# Altium footprint library custom.PcbLib: 305 footprints (part 18 of 20)
Each footprint in its own frame and in the unit in brackets; x right, y up, seen from the top. Pads: shape width x height; smd on the part's side, far side on the other; paste and mask are expansions set on the pad; w line width, h text height; cw(c..) or ccw(c..) is an arc to the next point about the centre after c.
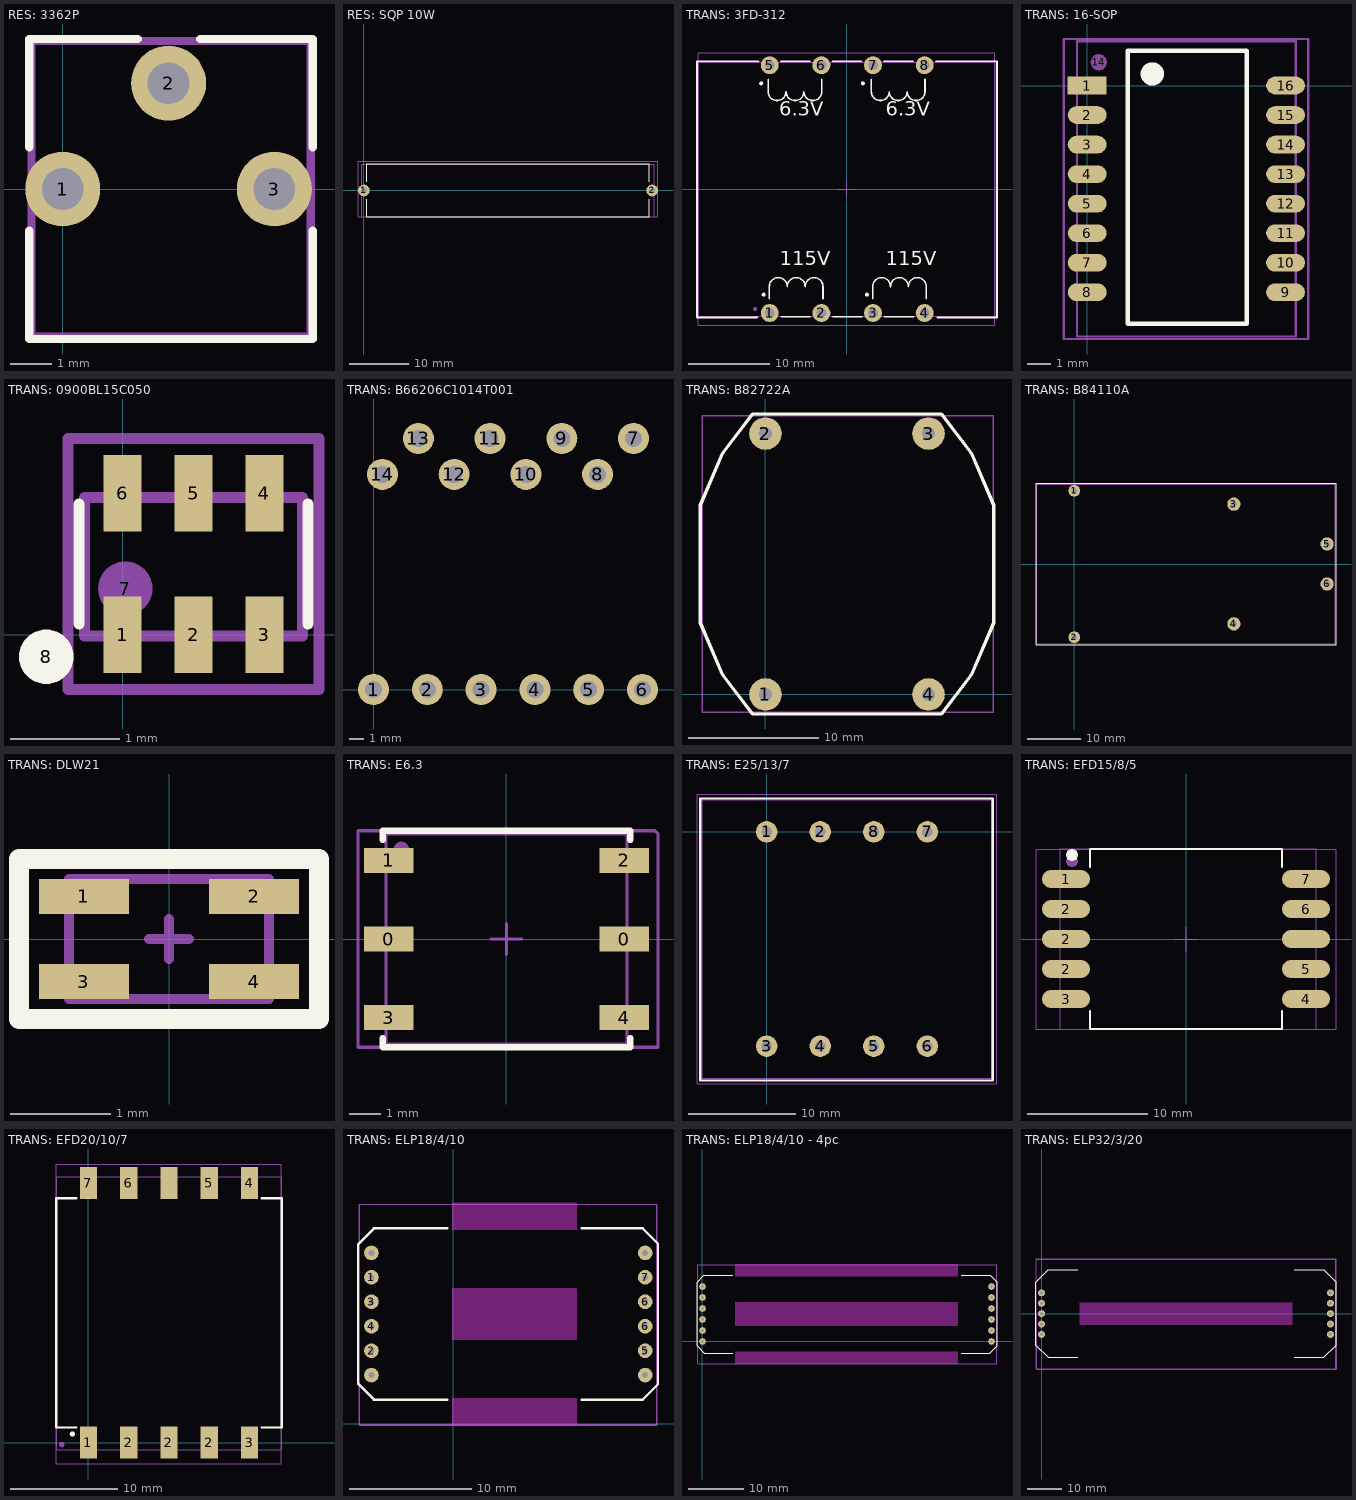
[diagram p17: the footprints below, top view; thin cyan lines are the x and y axes]

## RES: 3362P [mm]
pads (3):
  round 1.8 hole 1: 1(0,0) 2(2.54,2.54) 3(5.08,0)
Top Overlay:
  lines w0.2: -0.8,-1 -0.8,-3.6 6,-3.6 6,-1 ; -0.8,1 -0.8,3.6 1.8,3.6 ; 3.3,3.6 6,3.6 6,1
Top Assy:
  lines w0.1: -0.7,-3.49 5.9,-3.49 5.9,3.5 -0.7,3.5 -0.7,-3.49
Size Area:
  lines w0.1: -0.8,-3.6 6,-3.6 6,3.6 -0.8,3.6 -0.8,-3.6
3D body "User Library-R_3362P.STEP": height 4.5, standoff -3, extent -0.7,-3.49 5.9,3.5

## RES: SQP 10W [mm]
pads (2):
  round 2 hole 1: 1(0,0) 2(49,0)
Top Overlay:
  lines w0.2: 0.5,-1.5 0.5,-4.5 48.5,-4.5 48.5,-1.5 ; 0.5,1.5 0.5,4.5 48.5,4.5 48.5,1.5
Top Assy:
  lines w0.1: -0.4,4.4 -0.4,-4.5 49.4,-4.5 49.4,4.5 -0.4,4.5
Size Area:
  lines w0.1: -1,-4.5 -1,5 50,5 50,-4.5 -1,-4.5
3D body "User Library-SQP10AJB-1R8.STEP": height 10.55, standoff -4.04, extent -0.4,-4.5 49.4,4.5

## TRANS: 3FD-312 [mm]
pads (13):
  round 2.2 hole 1.2: 1(-9.45,-15.25) 2(-3.1,-15.25) 3(3.25,-15.25) 4(9.6,-15.25) 5(-9.45,15.23) 6(-3.1,15.23) 7(3.25,15.23) 8(9.6,15.23)
  round 0.5 on Mech1: ""(-11.25,-14.75)
  round 0.5 on Top Overlay: ""(-10.5,13) ""(-10.2,-13) ""(2,13) ""(2.5,-13)
Top Overlay:
  lines w0.2: -11,-15.8 -18.4,-15.8 -18.4,15.7 -10.8,15.7 ; -9.65,13.48 -9.65,11.98 ccw(c-8.55,11.98) -7.45,11.98 ccw(c-6.35,11.98) -5.25,11.98 ccw(c-4.15,11.98) -3.05,11.98 -3.05,13.48 ; -9.5,-13.5 -9.5,-12 cw(c-8.4,-12) -7.3,-12 cw(c-6.2,-12) -5.1,-12 cw(c-4,-12) -2.9,-12 -2.9,-13.5 ; -8.1,15.7 -4.5,15.7 ; -8.05,-15.72 -4.45,-15.72 ; -1.75,15.7 1.85,15.7 ; -1.7,-15.72 1.9,-15.72 ; 3.05,13.48 3.05,11.98 ccw(c4.15,11.98) 5.25,11.98 ccw(c6.35,11.98) 7.45,11.98 ccw(c8.55,11.98) 9.65,11.98 9.65,13.48 ; 3.2,-13.5 3.2,-12 cw(c4.3,-12) 5.4,-12 cw(c6.5,-12) 7.6,-12 cw(c8.7,-12) 9.8,-12 9.8,-13.5 ; 4.6,15.7 8.2,15.7 ; 4.65,-15.72 8.25,-15.72 ; 10.95,15.7 18.5,15.7 18.5,-15.8 11.15,-15.8
  text "115V" at -8.2,-10 h3
  text "115V" at 4.8,-10 h3
  text "6.3V" at -8.3,8.4 h3
  text "6.3V" at 4.8,8.4 h3
Top Assy:
  lines w0.1: -18.235,-15.65 -18.235,15.59 18.335,15.59 18.335,-15.65 -18.235,-15.65
Size Area:
  lines w0.1: -1,0 1,0 ; 0,-1 0,1 ; -18.25,-16.75 18.25,-16.75 18.25,16.75 -18.25,16.75 -18.25,-16.75
3D body "User Library-Tamura 3FD-312.STEP": height 32.1, standoff -4.8, extent -18.235,-15.65 18.335,15.59

## TRANS: 16-SOP [mm]
pads (17):
  rect 1.67x0.76 smd: 1(0,0)
  oval 1.67x0.76 smd: 2(0,-1.27) 3(0,-2.54) 4(0,-3.81) 5(0,-5.08) 6(0,-6.35) 7(0,-7.62) 8(0,-8.89) 9(8.53,-8.89) 10(8.53,-7.62) 11(8.53,-6.35) 12(8.53,-5.08) 13(8.53,-3.81) 14(8.53,-2.54) 15(8.53,-1.27) 16(8.53,0)
  round 0.7 on Mech1: 14(0.5,1)
Top Overlay:
  circle w0.6: c2.8,0.5 r0.2
  lines w0.2: 4.583,1.5 6.86,1.5 6.86,-10.25 1.75,-10.25 1.75,1.5 6,1.5
Top Assy:
  lines w0.1: -0.435,-10.795 -0.435,1.905 8.965,1.905 8.965,-10.795 -0.435,-10.795
Size Area:
  lines w0.1: -1,-10.9 9.5,-10.9 9.5,2 -1,2 -1,-10.9
3D body "User Library-smt4.step": height 5.1, standoff 0, extent -0.435,-10.795 8.965,1.905

## TRANS: 0900BL15C050 [mm]
pads (8):
  rect 0.35x0.7 smd: 1(0,0) 2(0.65,0) 3(1.3,0) 4(1.3,1.3) 5(0.65,1.3) 6(0,1.3)
  round 0.5 on Mech1: 7(0.025,0.425)
  round 0.5 on Top Overlay: 8(-0.7,-0.2)
Top Overlay:
  lines w0.1: -0.4,0.1 -0.4,1.2 ; 1.7,0.1 1.7,1.2
Top Assy:
  lines w0.1: -0.35,-0.01 -0.35,1.26 1.65,1.26 1.65,-0.01 -0.35,-0.01
Size Area:
  lines w0.1: -0.5,-0.5 -0.5,1.8 1.8,1.8 1.8,-0.5 -0.5,-0.5
3D body "User Library-1600BL15B100E.STEP": height 0.84, standoff -0.02, extent -0.35,-0.01 1.65,1.26

## TRANS: B66206C1014T001 [mm]
pads (14):
  round 2.2 hole 1.2: 1(0,0) 2(3.81,0) 3(7.62,0) 4(11.43,0) 5(15.24,0) 6(19.05,0) 7(18.415,17.78) 8(15.875,15.24) 9(13.335,17.78) 10(10.795,15.24) 11(8.255,17.78) 12(5.715,15.24) 13(3.175,17.78) 14(0.635,15.24)

## TRANS: B82722A [mm]
pads (4):
  round 2.5 hole 1: 1(0,0) 2(0,20) 3(12.5,20) 4(12.5,0)
Top Overlay:
  lines w0.254: -5,5.5 -5,14.5 -3.286,18.5 -1,21.5 13.5,21.5 15.786,18.5 17.5,14.5 17.5,5.5 15.786,1.5 13.5,-1.5 -1,-1.5 -3.286,1.5 -5,5.5
Top Assy:
  lines w0.1: -4.85,-1.35 -4.85,21.35 17.45,21.35 17.45,-1.35 -4.85,-1.35
3D body "User Library-B82722A.STEP": height 13.31, standoff -3.2, extent -4.85,-1.35 17.45,21.35

## TRANS: B84110A [mm]
pads (6):
  round 2.2 hole 1.1: 1(0,13.75) 2(0,-13.75)
  round 2.5 hole 1.2: 3(30,11.25) 4(30,-11.25) 5(47.5,3.75) 6(47.5,-3.75)
Top Overlay:
  lines w0.2: -7.175,-15.175 49.175,-15.175 49.175,15.175 -7.175,15.175 -7.175,-15.175
Top Assy:
  lines w0.1: 49,15 -7,15 -7,-15 49,-15 49,15 ; 49,15 49,15
Size Area:
  lines w0.1: -7,-15 -7,15 49,15 49,-15 -7,-15
3D body "B84110A.stp": height 23.1, standoff -4, extent -7,-15 49,15

## TRANS: DLW21 [mm]
pads (4):
  rect 0.9x0.35 smd: 1(-0.85,0.425) 2(0.85,0.425) 3(-0.85,-0.425) 4(0.85,-0.425)
Top Overlay:
  lines w0.2: -1.5,-0.8 -1.5,0.8 1.5,0.8 1.5,-0.8 -1.5,-0.8
Top Assy:
  lines w0.1: -1,-0.6 1,-0.6 1,0.6 -1,0.6 -1,-0.6
Size Area:
  lines w0.1: -0.2,0 0.2,0 ; 0,-0.2 0,0.2 ; -1.5,-0.8 1.5,-0.8 1.5,0.8 -1.5,0.8 -1.5,-0.8
3D body "User Library-EMI Filter DLW21S.STEP": height 1.2, standoff 0, extent -1,-0.6 1,0.6

## TRANS: E6.3 [mm]
pads (7):
  rect 1.6x0.8 smd: 0(-3.81,0) 0(3.81,0) 1(-3.81,2.54) 2(3.81,2.54) 3(-3.81,-2.54) 4(3.81,-2.54)
  round 0.5 on Mech1: ""(-3.4,2.9)
Top Overlay:
  lines w0.2: -4,-3.2 -4,-3.5 4,-3.5 4,-3.2 ; -4,3.2 -4,3.5 4,3.5 4,3.2
Top Assy:
  lines w0.1: -3.9,-3.4 -3.9,3.4 3.9,3.4 3.9,-3.4 -3.9,-3.4
Size Area:
  lines w0.1: -0.5,0 0.5,0 ; 0,-0.5 0,0.5 ; -4.8,-3.5 -4.8,3.5 4.8,3.5 4.9,3.4 4.9,-3.5 -4.8,-3.5
3D body "E6.3.STEP": height 5.05, standoff 0, extent -3.9,-3.4 3.9,3.4

## TRANS: E25/13/7 [mm]
pads (8):
  round 2 hole 1: 1(0,0) 2(5,0) 3(0,-20) 4(5,-20) 5(10,-20) 6(15,-20) 7(15,0) 8(10,0)
Top Overlay:
  lines w0.2: -6.2,-23.2 21.1,-23.2 21.1,3.1 -6.2,3.1 -6.2,-23.2
Top Assy:
  lines w0.1: -6,-23 21,-23 21,3 -6,3 -6,-23
Size Area:
  lines w0.1: -6.5,-23.5 -6.5,3.5 21.5,3.5 21.5,-23.5 -6.5,-23.5
3D body "User Library-Choke_E25.STEP": height 21.05, standoff -2.65, extent -6,-23 21,3

## TRANS: EFD15/8/5 [mm]
pads (12):
  rrect100% 4x1.5 smd: 1(-10,5) 2(-10,-2.5) 2(-10,0) 2(-10,2.5) 3(-10,-5) 4(10,-5) 5(10,-2.5) 6(10,2.5) 7(10,5) ""(10,0)
  round 1 on Mech1: ""(-9.5,6.5)
  round 1 on Top Overlay: ""(-9.5,7)
Top Overlay:
  lines w0.2: -8,-6 -8,-7.5 8,-7.5 8,-6 ; -8,6 -8,7.5 8,7.5 8,6
Top Assy:
  lines w0.1: -10.5,-7.5 10.85,-7.5 10.85,7.5 -10.5,7.5 -10.5,-7.5
Size Area:
  lines w0.1: -1,0 1,0 ; 0,-1 0,1 ; -12.5,-7.5 -12.5,7.5 12.5,7.5 12.5,-7.5 -12.5,-7.5
3D body "EFD15.STEP": height 8.15, standoff -0.05, extent -10.5,-7.5 10.85,7.5
3D body: height 0.25, standoff 0, extent -7.5,15 -7.5,15

## TRANS: EFD20/10/7 [mm]
pads (12):
  rect 1.6x3 smd: 1(0,0) 2(3.76,0) 2(7.52,0) 2(11.28,0) 3(15.04,0) 4(15.04,24.22) 5(11.28,24.22) 6(3.76,24.22) 7(0,24.22) ""(7.52,24.22)
  round 0.5 on Mech1: ""(-2.5,-0.2)
  round 0.5 on Top Overlay: ""(-1.5,0.8)
Top Overlay:
  lines w0.2: -1.1,1.4 -3,1.4 -3,22.8 -1.1,22.8 ; 16.14,1.4 18.04,1.4 18.04,22.8 16.14,22.8
Top Assy:
  lines w0.1: -2.96,-0.685 18.04,-0.685 18.04,24.815 -2.96,24.815 -2.96,-0.685
Size Area:
  lines w0.1: -3,-2 18,-2 18,26 -3,26 -3,-2
3D body "EFD20 SMD.STEP": height 10.41, standoff 0, extent -3.06,-0.685 17.94,24.815

## TRANS: ELP18/4/10 [mm]
pads (12):
  round 1.2 hole 0.5: 1(-6.7,12) 2(-6.7,6) 3(-6.7,10) 4(-6.7,8) 5(15.7,6) 6(15.7,8) 6(15.7,10) 7(15.7,12) ""(-6.7,4) ""(-6.7,14) ""(15.7,4) ""(15.7,14)
Top Overlay:
  lines w0.2: -0.5,2 -4.3,2 -6.5,2 -7.8,3.3 -7.8,14.7 -6.5,16 -0.5,16 ; 10.5,2 13.2,2 15.5,2 16.75,3.25 16.75,14.75 15.5,16 10.5,16
Keep-Out Layer:
  board cut-out: -0.1,-0.1 10.1,-0.1 10.1,2.1 -0.1,2.1
  board cut-out: -0.1,6.9 10.1,6.9 10.1,11.1 -0.1,11.1
  board cut-out: -0.1,15.9 10.1,15.9 10.1,18.1 -0.1,18.1
Top Assy:
  lines w0.1: -7.671,-0.011 -7.671,17.994 16.629,17.994 16.629,-0.011 -7.671,-0.011
Size Area:
  lines w0.1: -7.7,-0.1 -7.7,18 16.7,18 16.7,-0.1 -7.7,-0.1
3D body "transLast.STEP": height 4.95, standoff -3.05, extent -7.707,0 16.6,18

## TRANS: ELP18/4/10 - 4pc [mm]
pads (12):
  round 1.2 hole 0.5: 1(0,8) 2(0,2) 3(0,6) 4(0,4) 5(52.6,2) 6(52.6,4) 6(52.6,6) 7(52.6,8) ""(0,0) ""(0,10) ""(52.6,0) ""(52.6,10)
Top Overlay:
  lines w0.2: 5.5,-2.1 0.3,-2.1 -1,-0.8 -1,10.8 0.25,12.05 5.5,12.05 ; 47.1,-2.1 52.3,-2.1 53.6,-0.8 53.6,10.8 52.35,12.05 47.1,12.05
Keep-Out Layer:
  board cut-out: 6,-4.1 46.5,-4.1 46.5,-1.9 6,-1.9
  board cut-out: 6,2.9 46.5,2.9 46.5,7.1 6,7.1
  board cut-out: 6,11.9 46.5,11.9 46.5,14.1 6,14.1
3D model:
  lines w0.1: -0.875,-4.025 53.525,-4.025 53.525,13.975 -0.875,13.975 -0.875,-4.025 ; -0.875,-4.025 -0.875,-4.025
Size Area:
  lines w0.1: -0.875,-4.025 53.525,-4.025 53.525,13.975 -0.875,13.975 -0.875,-4.025
3D body "Transformer 120W.STEP": height 4.95, standoff -3.05, extent -0.875,-4.025 53.525,13.975

## TRANS: ELP32/3/20 [mm]
pads (10):
  round 2 hole 1: 0(0,0) 1(0,6) 2(0,3) 3(0,-3) 4(0,-6) 5(83.5,-6) 5(83.5,-3) 6(83.5,0) 7(83.5,3) 7(83.5,6)
Top Overlay:
  lines w0.2: 10.5,-12.65 1.95,-12.65 -1.6,-9.1 -1.6,0 -1.6,9.1 1.95,12.65 10.5,12.65 ; 73,-12.65 81.55,-12.65 85.1,-9.1 85.1,0 85.1,9.1 81.55,12.65 73,12.65
Keep-Out Layer:
  board cut-out: 72.425,3.2 72.425,-3.2 11.1,-3.2 11.1,3.2
Top Assy:
  lines w0.1: -1.5,-15.975 85,-15.975 85,15.775 -1.5,15.775 -1.5,-15.975
Size Area:
  lines w0.1: -1.6,-16 -1.6,15.8 85.1,15.8 85.1,-16 -1.6,-16
3D body "Планарный трансформатор ELP32.STEP": height 7.62, standoff -5.08, extent -1.5,-15.975 85,15.775